# Altium footprint library DPIAT_202303.PcbLib: 77 footprints (part 3 of 5)
Each footprint in its own frame and in the unit in brackets; x right, y up, seen from the top. Pads: shape width x height; smd on the part's side, far side on the other; paste and mask are expansions set on the pad; w line width, h text height; cw(c..) or ccw(c..) is an arc to the next point about the centre after c.
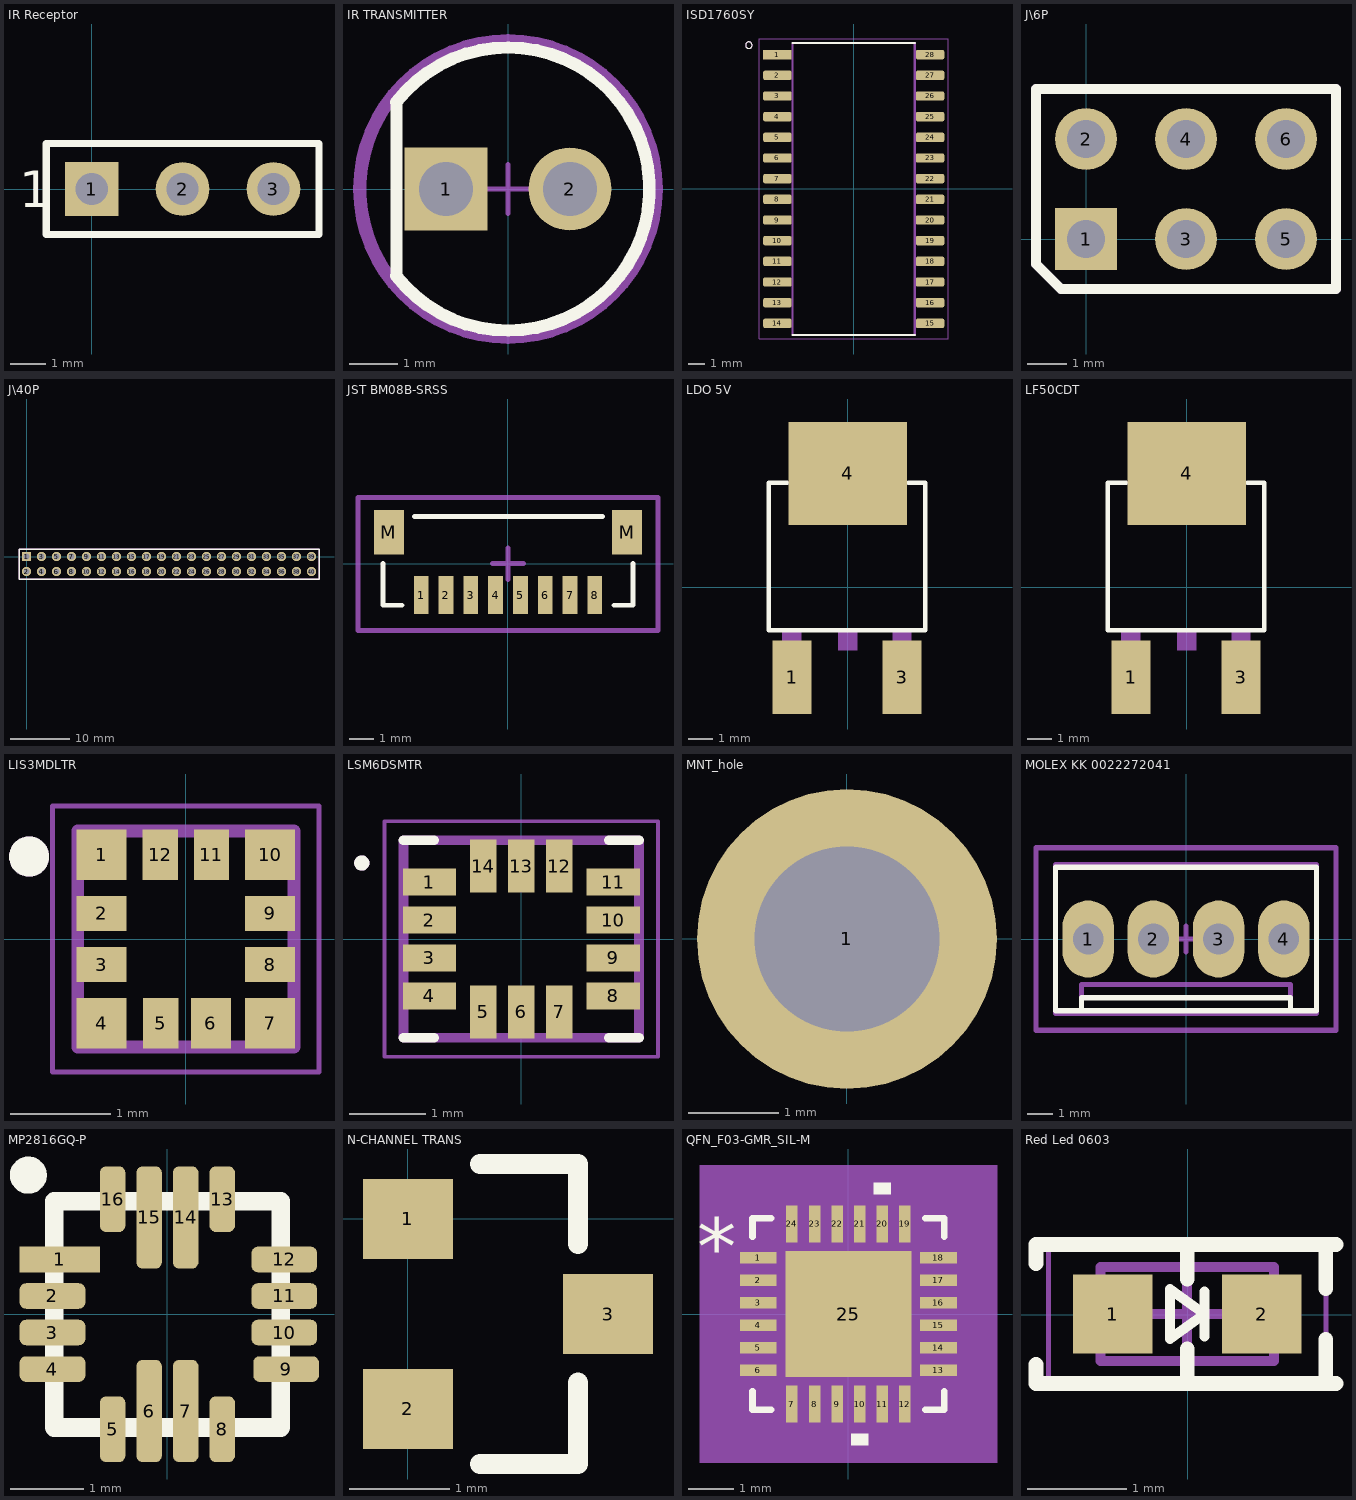
[diagram p2: the footprints below, top view; thin cyan lines are the x and y axes]

## IR Receptor [mm]
pads (3):
  rect 1.5x1.5 hole 0.9: 1(0,0)
  round 1.5 hole 0.9: 2(2.54,0) 3(5.08,0)
Top Overlay:
  lines w0.2: -1.27,-1.27 0.635,-1.27 6.354,-1.27 6.354,1.27 0.635,1.27 -1.27,1.27 -1.27,-1.27
  text "1" at -2.032,-0.508 h1.02
3D body "82687Minicast_SS.stp": height 10.16, standoff -20.34, extent -0.381,-3.392 5.399,1.397

## IR TRANSMITTER [mm]
pads (2):
  rect 1.7x1.7 hole 1.1 paste-1000 mask+0: 1(-1.27,0)
  round 1.7 hole 1.1 paste-1000 mask+0: 2(1.27,0)
Top Overlay:
  lines w0.254: -2.29,-1.781 ccw(c0,0) -2.29,1.781 ; -2.286,-1.778 -2.286,1.778
Top 3D Body:
  circle w0.15: c0,0 r2.975
Top Courtyard:
  lines w0.2: -3.075,0 cw(c0,0) 3.075,0 cw(c0,0) -3.075,0
Top Component Center:
  lines w0.1: -0.5,0 0.5,0 ; 0,-0.5 0,0.5
3D body "Diode_Vishay_TSAL6100_eec.STEP": height 0.25, standoff 0, extent -3.075,-3.075 3.075,3.075

## ISD1760SY [mm] "Enregistreur Speaker programable SPI-I2C"
pads (28):
  rect 1.75x0.58 smd: 1(-4.697,8.241)
  rrect40% 1.75x0.58 smd: 2(-4.697,6.971) 3(-4.697,5.701) 4(-4.697,4.431) 5(-4.697,3.161) 6(-4.697,1.891) 7(-4.697,0.621) 8(-4.697,-0.649) 9(-4.697,-1.919) 10(-4.697,-3.189) 11(-4.697,-4.459) 12(-4.697,-5.729) 13(-4.697,-6.999) 14(-4.697,-8.269) 15(4.683,-8.269) 16(4.683,-6.999) 17(4.683,-5.729) 18(4.683,-4.459) 19(4.683,-3.189) 20(4.683,-1.919) 21(4.683,-0.649) 22(4.683,0.621) 23(4.683,1.891) 24(4.683,3.161) 25(4.683,4.431) 26(4.683,5.701) 27(4.683,6.971) 28(4.683,8.241)
Top Overlay:
  circle w0: c-6.447,8.821 r0.2
  lines w0.127: -3.76,-8.982 3.745,-8.982 ; -3.76,8.953 3.745,8.953
Mechanical 13:
  circle w0: c-6.447,8.821 r0.2
  lines w0.127: -3.76,-8.982 3.745,-8.982 3.745,8.953 -3.76,8.953 -3.76,-8.982
Mechanical 15:
  lines w0.05: -5.822,-9.232 5.808,-9.232 5.808,9.203 -5.822,9.203 -5.822,-9.232
3D body "73S8010C-IL_F.STEP": height 2.65, standoff 0, extent -5.17,-8.964 5.155,8.936

## J\6P [mil]
pads (6):
  rect 62x62 / inner round 62 / far side round 62 hole 38: 1(0,0)
  round 62 hole 38: 2(0,100) 3(100,0) 4(100,100) 5(200,0) 6(200,100)
Top Overlay:
  lines w10: -50,-25 -50,150 250,150 250,-50 -25,-50 -50,-25
  text ".Designator" at -100,175 h60
Mechanical 1:
  lines w10: -50,-25 -50,150 250,150 250,-50 -25,-50 -50,-25
  text ".Designator" at -100,175 h60
  text ".Pattern" at -25,-200 h60

## J\40P [mil]
pads (40):
  rect 62x62 / inner round 62 / far side round 62 hole 38: 1(-1,0)
  round 62 hole 38: 2(-1,-100) 3(99,0) 4(99,-100) 5(199,0) 6(199,-100) 7(299,0) 8(299,-100) 9(399,0) 10(399,-100) 11(499,0) 12(499,-100) 13(599,0) 14(599,-100) 15(699,0) 16(699,-100) 17(799,0) 18(799,-100) 19(899,0) 20(899,-100) 21(999,0) 22(999,-100) 23(1099,0) 24(1099,-100) 25(1199,0) 26(1199,-100) 27(1299,0) 28(1299,-100) 29(1399,0) 30(1399,-100) 31(1499,0) 32(1499,-100) 33(1599,0) 34(1599,-100) 35(1699,0) 36(1699,-100) 37(1799,0) 38(1799,-100) 39(1899,0) 40(1899,-100)
Top Overlay:
  lines w10: -51,-150 -51,50 1949,50 1949,-150 -51,-150
  text ".Designator" at -26,-175 h60
Mechanical 1:
  lines w10: -51,-150 1949,-150 1949,50 -51,50 -51,-150
  text ".Pattern" at -26,175 h60
  text ".Designator" at -26,-175 h60

## JST BM08B-SRSS [mm] "8 pin JST Conn SM"
pads (10):
  rect 0.6x1.55 smd: 1(-3.5,-1.262) 2(-2.5,-1.262) 3(-1.5,-1.262) 4(-0.5,-1.262) 5(0.5,-1.262) 6(1.5,-1.262) 7(2.5,-1.262) 8(3.5,-1.262)
  rect 1.2x1.8 smd: M(-4.8,1.262) M(4.8,1.262)
Top Overlay:
  lines w0.2: -5.032,0.008 -5.032,-1.676 -4.27,-1.676 ; -3.77,1.905 3.81,1.905 ; 4.27,-1.676 5.032,-1.676 5.032,0.008
Mechanical 15:
  lines w0.2: -0.635,0 0.635,0 ; 0,-0.635 0,0.635 ; -6.048,-2.692 6.048,-2.692 6.048,2.667 -6.048,2.667 -6.048,-2.692
3D body "JST BM08B-SRSS-TB.STEP": height 4.32, standoff 0, extent -5,-1.688 5,1.912

## LDO 5V [mil]
pads (3):
  rect 63x118 smd: 1(-89,-144) 3(87,-144)
  rect 190x165 smd: 4(0,182)
Top Overlay:
  lines w7: -97,167 -126,167 -126,-69 124,-69 124,167 97,167
Mechanical 13:
  region: -74,-176.51 -104.3,-176.51 -104.3,-71 -74,-71
  region: 102,-176.27 72.11,-176.27 72.11,-71 102,-71
  region: 15,-101.25 -15.04,-101.25 -15.04,-71 15,-71
  lines w6: -97,167 97,167
  lines w40: -68,189 67,189
  text "1" at -95.14,-62.09 h24.04
  text "2" at -8.02,-62.12 h24.05
  text "3" at 78.05,-62.04 h24.02
  text "4" at -13.03,135.34 h24.06
3D body "LF50CDT-TR.STEP": height 94.49, standoff 0, extent -127.13,-158.09 128.78,224.79

## LF50CDT [mil] "Reg Lin 5V 500mA"
pads (3):
  rect 63x118 smd: 1(-89,-144) 3(87,-144)
  rect 190x165 smd: 4(0,182)
Top Overlay:
  lines w7: -97,167 -126,167 -126,-69 124,-69 124,167 97,167
Mechanical 13:
  region: -74,-176.51 -104.3,-176.51 -104.3,-71 -74,-71
  region: 102,-176.27 72.11,-176.27 72.11,-71 102,-71
  region: 15,-101.25 -15.04,-101.25 -15.04,-71 15,-71
  lines w6: -97,167 97,167
  lines w40: -68,189 67,189
  text "1" at -95.14,-62.09 h24.04
  text "2" at -8.02,-62.12 h24.05
  text "3" at 78.05,-62.04 h24.02
  text "4" at -13.03,135.34 h24.06
3D body "LF50CDT-TR.STEP": height 94.49, standoff 0, extent -127.13,-158.09 128.78,224.79

## LIS3MDLTR [mm] "Magnetometre"
pads (12):
  rect 0.5x0.5 smd mask+0: 1(-0.838,0.838) 4(-0.838,-0.838) 7(0.838,-0.838) 10(0.838,0.838)
  rect 0.5x0.35 smd mask+0: 2(-0.838,0.254) 3(-0.838,-0.254) 8(0.838,-0.254) 9(0.838,0.254)
  rect 0.35x0.5 smd mask+0: 5(-0.25,-0.839) 11(0.254,0.838) 12(-0.254,0.838)
  rect 0.4x0.5 smd mask+0: 6(0.25,-0.839)
Top Overlay:
  circle w0.2: c-1.56,0.82 r0.1
Top Solder:
  region: 1.143,-1.143 0.525,-1.143 0.525,-0.525 1.143,-0.525
  region: -0.525,-1.143 -1.143,-1.143 -1.143,-0.525 -0.525,-0.525
  region: 1.143,0.525 0.525,0.525 0.525,1.143 1.143,1.143
  region: -0.525,0.525 -1.143,0.525 -1.143,1.143 -0.525,1.143
  region: -0.525,0.025 -1.143,0.025 -1.143,0.475 -0.525,0.475
  region: -0.525,-0.475 -1.143,-0.475 -1.143,-0.025 -0.525,-0.025
  region: 1.143,0.025 0.525,0.025 0.525,0.475 1.143,0.475
  region: 1.143,-0.475 0.525,-0.475 0.525,-0.025 1.143,-0.025
  region: -0.025,-1.143 -0.475,-1.143 -0.475,-0.525 -0.025,-0.525
  region: -0.025,0.525 -0.475,0.525 -0.475,1.143 -0.025,1.143
  region: 0.475,0.525 0.025,0.525 0.025,1.143 0.475,1.143
  region: 0.475,-1.143 0.025,-1.143 0.025,-0.525 0.475,-0.525
Mechanical 13:
  circle w0.2: c-1.56,0.82 r0.1
  lines w0.127: -1.075,-1.075 -1.075,1.075 1.075,1.075 1.075,-1.075 -1.075,-1.075
Mechanical 15:
  lines w0.05: -1.325,-1.325 -1.325,1.325 1.325,1.325 1.325,-1.325 -1.325,-1.325
3D body "LIS3MDLTR--3DModel-STEP-56544.STEP": height 1, standoff 0, extent -0.999,-1.01 1.001,0.99

## LSM6DSMTR [mm] "3D sensor (Accel, gyro, temperature)"
pads (14):
  rect 0.7x0.35 smd: 1(-1.21,0.75) 2(-1.21,0.25) 3(-1.21,-0.25) 4(-1.21,-0.75) 8(1.21,-0.75) 9(1.21,-0.25) 10(1.21,0.25) 11(1.21,0.75)
  rect 0.35x0.7 smd: 5(-0.5,-0.96) 6(0,-0.96) 7(0.5,-0.96) 12(0.5,0.96) 13(0,0.96) 14(-0.5,0.96)
Top Overlay:
  circle w0.1: c-2.1,1 r0.05
  lines w0.127: -1.55,-1.3 -1.15,-1.3 ; -1.55,1.3 -1.15,1.3 ; 1.15,-1.3 1.55,-1.3 ; 1.15,1.3 1.55,1.3
Mechanical 13:
  circle w0.1: c-2.1,1 r0.05
  lines w0.127: -1.55,-1.3 1.55,-1.3 1.55,1.3 -1.55,1.3 -1.55,-1.3
Mechanical 15:
  lines w0.05: -1.8,-1.55 -1.8,1.55 1.8,1.55 1.8,-1.55 -1.8,-1.55
3D body "LSM6DSMTR--3DModel-STEP-56544.STEP": height 0.86, standoff 0, extent -1.5,-1.25 1.5,1.25

## MNT_hole [mil]
pads (1):
  round 130 hole 80: 1(0,0)

## MOLEX KK 0022272041 [mm]
height 11.6
pads (4):
  oval 2x3 hole 1.2: 1(-3.81,0) 2(-1.27,0) 3(1.27,0) 4(3.81,0)
Top Overlay:
  lines w0.2: -4.064,-2.794 -4.064,-2.286 4.064,-2.286 4.064,-2.794 ; -5.08,-2.794 5.08,-2.794 5.08,2.794 -5.08,2.794 -5.08,-2.794
Mechanical 13:
  lines w0.2: -4.064,-2.9 -4.064,-1.778 4.064,-1.778 4.064,-2.9 ; -5.08,-2.9 -5.08,2.9 5.08,2.9 5.08,-2.9 -5.08,-2.9
Mechanical 15:
  lines w0.2: -0.508,0 0.508,0 ; 0,-0.508 0,0.508 ; -5.842,-3.556 -5.842,3.556 5.842,3.556 5.842,-1.016 5.842,-3.556 -3.556,-3.556 -5.842,-3.556
3D body "MOLEX KK 022272041.STEP": height 11.7, standoff -3.56, extent -5.08,-2.9 5.08,2.9

## MP2816GQ-P [mm] "Footprint for the buck boost MP2816GQ-P"
pads (16):
  rect 1.1x0.35 smd: 1(-1.475,0.75)
  rrect50% 0.9x0.35 smd: 2(-1.574,0.25) 3(-1.574,-0.25) 4(-1.574,-0.75) 9(1.625,-0.75) 10(1.6,-0.25) 11(1.6,0.25) 12(1.6,0.75)
  rrect50% 0.35x0.9 smd: 5(-0.75,-1.574) 8(0.75,-1.574) 13(0.75,1.575) 16(-0.75,1.575)
  rrect50% 0.35x1.4 smd: 6(-0.25,-1.325) 7(0.25,-1.325) 14(0.25,1.325) 15(-0.25,1.325)
Top Overlay:
  circle w0.254: c-1.905,1.905 r0.127
  lines w0.254: -1.55,-1.55 -1.55,1.55 1.55,1.55 1.55,-1.55 -1.55,-1.55
3D body: height 1, standoff 0, extent -1.55,-1.55 1.55,1.55

## N-CHANNEL TRANS [mm]
pads (3):
  rect 0.9x0.8 smd: 1(0,0) 2(0,-1.9) 3(2,-0.95)
Top Overlay:
  lines w0.2: 0.721,-2.45 1.7,-2.45 1.7,-1.636 ; 0.721,0.55 1.7,0.55 1.7,-0.25
3D body "FDN359AN.STEP": height 1.12, standoff 0, extent -0.341,-2.425 2.169,0.495

## QFN_F03-GMR_SIL-M [mil]
pads (25):
  rect 32x10 smd paste+0 mask+0: 1(-78.5,49.23) 2(-78.5,29.54) 3(-78.5,9.85) 4(-78.5,-9.85) 5(-78.5,-29.54) 6(-78.5,-49.23) 13(78.5,-49.23) 14(78.5,-29.54) 15(78.5,-9.85) 16(78.5,9.85) 17(78.5,29.54) 18(78.5,49.23)
  rect 10x32 smd paste+0 mask+0: 7(-49.23,-78.5) 8(-29.54,-78.5) 9(-9.85,-78.5) 10(9.85,-78.5) 11(29.54,-78.5) 12(49.23,-78.5) 19(49.23,78.5) 20(29.54,78.5) 21(9.85,78.5) 22(-9.85,78.5) 23(-29.54,78.5) 24(-49.23,78.5)
  rect 110x110 smd paste-54.5 mask+0: 25(0,0)
Top Overlay:
  region: 37.03,104.5 22.04,104.5 22.04,114.5 37.03,114.5
  region: 17.34,-104.5 2.35,-104.5 2.35,-114.5 17.34,-114.5
  lines w6: -83.5,-67.33 -83.5,-83.5 -67.33,-83.5 ; -83.5,67.33 -83.5,83.5 -67.33,83.5 ; 67.33,-83.5 83.5,-83.5 83.5,-67.33 ; 67.33,83.5 83.5,83.5 83.5,67.33
  text "*" at -132,34.07 h50
Top Paste:
  region: 51.06,-3.94 3.94,-3.94 3.94,-51.06 51.06,-51.06
  region: 51.06,51.06 3.94,51.06 3.94,3.94 51.06,3.94
  region: -3.94,-3.94 -51.06,-3.94 -51.06,-51.06 -3.94,-51.06
  region: -3.94,51.06 -51.06,51.06 -51.06,3.94 -3.94,3.94
Mechanical 5:
  region: 129.5,-129.5 -129.5,-129.5 -129.5,129.5 129.5,129.5
Mechanical 13:
  lines w1: -78.5,28.5 -28.5,78.5 ; -78.5,-78.5 -78.5,78.5 78.5,78.5 78.5,-78.5 -78.5,-78.5 ; -78.5,-55.23 -78.5,-43.23 -78.5,-55.23 ; -78.5,-35.53 -78.5,-23.54 -78.5,-35.53 ; -78.5,-15.85 -78.5,-3.85 -78.5,-15.85 ; -78.5,3.85 -78.5,15.85 -78.5,3.85 ; -78.5,23.54 -78.5,35.53 -78.5,23.54 ; -78.5,43.23 -78.5,55.23 -78.5,43.23 ; -55.23,-78.5 -43.23,-78.5 -55.23,-78.5 ; -55.23,78.5 -43.23,78.5 -55.23,78.5 ; -35.53,-78.5 -23.54,-78.5 -35.53,-78.5 ; -35.53,78.5 -23.54,78.5 -35.53,78.5 ; -15.85,-78.5 -3.85,-78.5 -15.85,-78.5 ; -15.85,78.5 -3.85,78.5 -15.85,78.5 ; 3.85,-78.5 15.85,-78.5 3.85,-78.5 ; 3.85,78.5 15.85,78.5 3.85,78.5 ; 23.54,-78.5 35.53,-78.5 23.54,-78.5 ; 23.54,78.5 35.53,78.5 23.54,78.5 ; 43.23,-78.5 55.23,-78.5 43.23,-78.5 ; 43.23,78.5 55.23,78.5 43.23,78.5 ; 78.5,-55.23 78.5,-43.23 78.5,-55.23 ; 78.5,-35.53 78.5,-23.54 78.5,-35.53 ; 78.5,-15.85 78.5,-3.85 78.5,-15.85 ; 78.5,3.85 78.5,15.85 78.5,3.85 ; 78.5,23.54 78.5,35.53 78.5,23.54 ; 78.5,43.23 78.5,55.23 78.5,43.23
  text "*" at -75,34.07 h50
Mechanical 15:
  region: -74.22,-98.5 -98.5,-98.5 -98.5,-74.22 -114.5,-74.22 -114.5,74.22 -98.5,74.22 -98.5,98.5 -74.22,98.5 -74.22,114.5 74.22,114.5 74.22,98.5 98.5,98.5 98.5,74.22 114.5,74.22 114.5,-74.22 98.5,-74.22 98.5,-98.5 74.22,-98.5 74.22,-114.5 -74.22,-114.5
  lines w6: -114.5,-74.22 -114.5,74.22 -98.5,74.22 -98.5,98.5 -74.22,98.5 -74.22,114.5 74.22,114.5 74.22,98.5 98.5,98.5 98.5,74.22 114.5,74.22 114.5,-74.22 98.5,-74.22 98.5,-98.5 74.22,-98.5 74.22,-114.5 -74.22,-114.5 -74.22,-98.5 -98.5,-98.5 -98.5,-74.22 -114.5,-74.22
3D body "QFN_F03-GMR_SIL.step": height 32.09, standoff 0, extent -78.5,-78.5 78.5,78.5

## Red Led 0603 [mm] "red led smd"
pads (2):
  rect 0.8x0.8 smd: 1(-0.756,0.008) 2(0.744,0.008)
Top Overlay:
  lines w0.1: 0.169,-0.217 0.169,0.008 ; 0.169,0.233 0.169,0.008 ; 0.169,0.008 -0.181,-0.242 -0.181,0.008 -0.181,0.258 0.169,0.008
  lines w0.15: -1.53,-0.5 -1.53,-0.692 1.494,-0.692 ; -1.53,0.516 -1.53,0.708 1.494,0.708 ; -0.006,-0.692 -0.006,-0.342 ; -0.006,0.358 -0.006,0.708 ; 1.391,-0.692 1.391,-0.246 ; 1.391,0.262 1.391,0.708
Mechanical 13:
  lines w0.1: -0.881,-0.467 0.869,-0.467 0.869,0.483 -0.881,0.483 -0.881,-0.467
Mechanical 15:
  lines w0.05: -1.403,-0.742 1.391,-0.742 1.391,0.758 -1.403,0.758 -1.403,-0.742
  lines w0.1: -0.481,0.008 0.469,0.008 ; -0.006,-0.467 -0.006,0.483
3D body "LED 0603 Base RED.STEP": height 0.28, standoff 0, extent -0.806,-0.392 0.794,0.408
3D body "LED 0603 Lens RED.STEP": height 0.53, standoff 0.18, extent -0.556,-0.392 0.544,0.408